# Altium schematic symbol library jlcpcb_2025_04_capacitors_extended_1206.schlib: 2503 symbols (part 10 of 14)
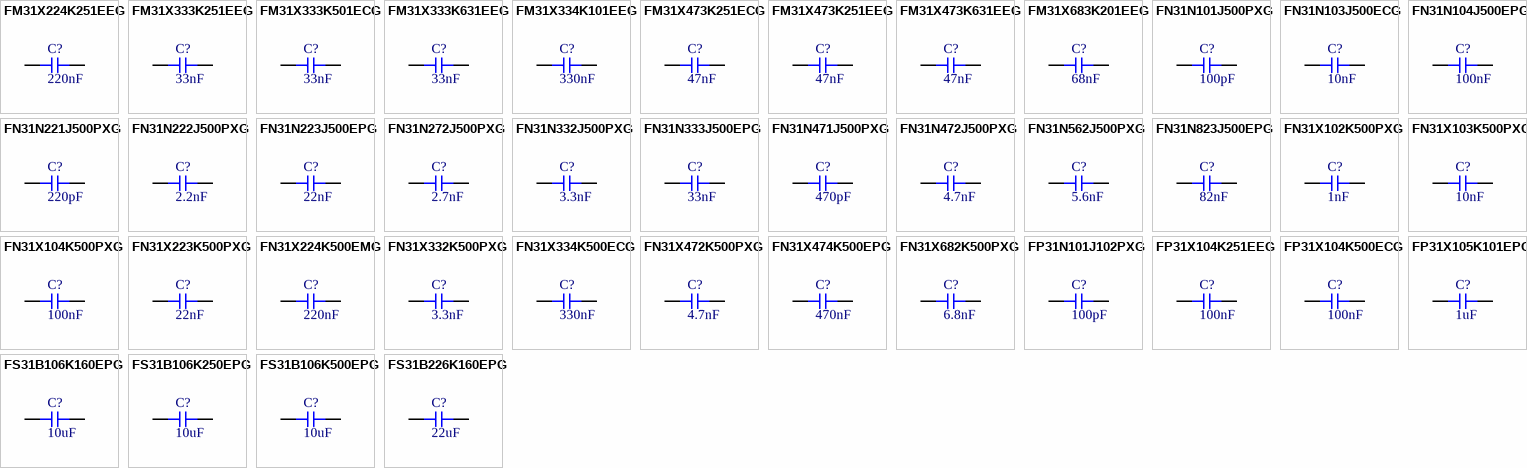
[diagram p71: symbols FM31X224K251EEG to FS31B226K160EPG]

## FN31N101J500PXG
designator C?  Capacitance: 100pF  (hidden comment: *)
Capacitor, Ceramic (MLCC), 100pF, 50V, C0G, SMD 1206; Manufacturer: PSA(Prosperity Dielectrics); Manufacturer Part Number: FN31N101J500PXG; Package Size: 1206; JLCPCB Basic Part: No; JLCPCB Part Number: C2915682; Supplier 1: LCSC; Category: Capacitors - MLCC; Supplier Part Number 1: C2915682; Voltage Rating: 50V; Temperature Coefficient: C0G; RoHS: Yes; ComponentLink1Description: Datasheet; ComponentLink1URL: https://wmsc.lcsc.com/wmsc/upload/file/pdf/v2/lcsc/2111172030_PSA-Prosperity-Dielectrics-FN31N101J500PXG_C2915682.pdf; ComponentLink2Description: JLCPCB Part URL; ComponentLink2URL: https://jlcpcb.com/partdetail/C2915682; ComponentLink3Description: LCSC Part URL; ComponentLink3URL: https://lcsc.com/product-detail/Multilayer-Ceramic-Capacitors-MLCC---SMD-SMT_PSAProsperity-Dielectrics-PSAProsperity-Dielectrics-FN31N101J500PXG_C2915682.html
footprint CAP-1206 (1206 (3216M) Capacitor)
pins: 1, 2

## FN31N103J500ECG
designator C?  Capacitance: 10nF  (hidden comment: *)
Capacitor, Ceramic (MLCC), 10nF, ±5%, 50V, NP0, ±5%, SMD 1206; Manufacturer: PSA(Prosperity Dielectrics); Manufacturer Part Number: FN31N103J500ECG; Package Size: 1206; JLCPCB Basic Part: No; JLCPCB Part Number: C784097; Supplier 1: LCSC; Category: Capacitors - MLCC; Supplier Part Number 1: C784097; Tolerance: ±5%; Voltage Rating: 50V; Temperature Coefficient: NP0; RoHS: Yes; ComponentLink1Description: Datasheet; ComponentLink1URL: https://wmsc.lcsc.com/wmsc/upload/file/pdf/v2/lcsc/2304140030_PSA-Prosperity-Dielectrics-FN31N103J500ECG_C784097.pdf; ComponentLink2Description: JLCPCB Part URL; ComponentLink2URL: https://jlcpcb.com/partdetail/C784097; ComponentLink3Description: LCSC Part URL; ComponentLink3URL: https://lcsc.com/product-detail/Multilayer-Ceramic-Capacitors-MLCC---SMD-SMT_PSAProsperity-Dielectrics-PSAProsperity-Dielectrics-FN31N103J500ECG_C784097.html
footprint CAP-1206 (1206 (3216M) Capacitor)
pins: 1, 2

## FN31N104J500EPG
designator C?  Capacitance: 100nF  (hidden comment: *)
Capacitor, Ceramic (MLCC), 100nF, 50V, C0G, SMD 1206; Manufacturer: PSA(Prosperity Dielectrics); Manufacturer Part Number: FN31N104J500EPG; Package Size: 1206; JLCPCB Basic Part: No; JLCPCB Part Number: C2874765; Supplier 1: LCSC; Category: Capacitors - MLCC; Supplier Part Number 1: C2874765; Voltage Rating: 50V; Temperature Coefficient: C0G; RoHS: Yes; ComponentLink1Description: Datasheet; ComponentLink1URL: https://wmsc.lcsc.com/wmsc/upload/file/pdf/v2/lcsc/2108150330_PSA-Prosperity-Dielectrics-FN31N104J500EPG_C2874765.pdf; ComponentLink2Description: JLCPCB Part URL; ComponentLink2URL: https://jlcpcb.com/partdetail/C2874765; ComponentLink3Description: LCSC Part URL; ComponentLink3URL: https://lcsc.com/product-detail/Multilayer-Ceramic-Capacitors-MLCC---SMD-SMT_PSAProsperity-Dielectrics-PSAProsperity-Dielectrics-FN31N104J500EPG_C2874765.html
footprint CAP-1206 (1206 (3216M) Capacitor)
pins: 1, 2

## FN31N221J500PXG
designator C?  Capacitance: 220pF  (hidden comment: *)
Capacitor, Ceramic (MLCC), 220pF, ±5%, 50V, C0G, ±5%, SMD 1206; Manufacturer: PSA(Prosperity Dielectrics); Manufacturer Part Number: FN31N221J500PXG; Package Size: 1206; JLCPCB Basic Part: No; JLCPCB Part Number: C2915684; Supplier 1: LCSC; Category: Capacitors - MLCC; Supplier Part Number 1: C2915684; Tolerance: ±5%; Voltage Rating: 50V; Temperature Coefficient: C0G; RoHS: Yes; ComponentLink1Description: Datasheet; ComponentLink1URL: https://wmsc.lcsc.com/wmsc/upload/file/pdf/v2/lcsc/2111172030_PSA-Prosperity-Dielectrics-FN31N221J500PXG_C2915684.pdf; ComponentLink2Description: JLCPCB Part URL; ComponentLink2URL: https://jlcpcb.com/partdetail/C2915684; ComponentLink3Description: LCSC Part URL; ComponentLink3URL: https://lcsc.com/product-detail/Multilayer-Ceramic-Capacitors-MLCC---SMD-SMT_PSAProsperity-Dielectrics-PSAProsperity-Dielectrics-FN31N221J500PXG_C2915684.html
footprint CAP-1206 (1206 (3216M) Capacitor)
pins: 1, 2

## FN31N222J500PXG
designator C?  Capacitance: 2.2nF  (hidden comment: *)
Capacitor, Ceramic (MLCC), 2.2nF, ±5%, 50V, NP0, ±5%, SMD 1206; Manufacturer: PSA(Prosperity Dielectrics); Manufacturer Part Number: FN31N222J500PXG; Package Size: 1206; JLCPCB Basic Part: No; JLCPCB Part Number: C784098; Supplier 1: LCSC; Category: Capacitors - MLCC; Supplier Part Number 1: C784098; Tolerance: ±5%; Voltage Rating: 50V; Temperature Coefficient: NP0; RoHS: Yes; ComponentLink1Description: Datasheet; ComponentLink1URL: https://wmsc.lcsc.com/wmsc/upload/file/pdf/v2/lcsc/2304140030_PSA-Prosperity-Dielectrics-FN31N222J500PXG_C784098.pdf; ComponentLink2Description: JLCPCB Part URL; ComponentLink2URL: https://jlcpcb.com/partdetail/C784098; ComponentLink3Description: LCSC Part URL; ComponentLink3URL: https://lcsc.com/product-detail/Multilayer-Ceramic-Capacitors-MLCC---SMD-SMT_PSAProsperity-Dielectrics-PSAProsperity-Dielectrics-FN31N222J500PXG_C784098.html
footprint CAP-1206 (1206 (3216M) Capacitor)
pins: 1, 2

## FN31N223J500EPG
designator C?  Capacitance: 22nF  (hidden comment: *)
Capacitor, Ceramic (MLCC), 22nF, ±5%, 50V, ±5%, SMD 1206; Manufacturer: PSA(Prosperity Dielectrics); Manufacturer Part Number: FN31N223J500EPG; Package Size: 1206; JLCPCB Basic Part: No; JLCPCB Part Number: C784099; Supplier 1: LCSC; Category: Capacitors - MLCC; Supplier Part Number 1: C784099; Tolerance: ±5%; Voltage Rating: 50V; RoHS: Yes; ComponentLink1Description: Datasheet; ComponentLink1URL: https://wmsc.lcsc.com/wmsc/upload/file/pdf/v2/lcsc/2304140030_PSA-Prosperity-Dielectrics-FN31N223J500EPG_C784099.pdf; ComponentLink2Description: JLCPCB Part URL; ComponentLink2URL: https://jlcpcb.com/partdetail/C784099; ComponentLink3Description: LCSC Part URL; ComponentLink3URL: https://lcsc.com/product-detail/Multilayer-Ceramic-Capacitors-MLCC---SMD-SMT_PSAProsperity-Dielectrics-PSAProsperity-Dielectrics-FN31N223J500EPG_C784099.html
footprint CAP-1206 (1206 (3216M) Capacitor)
pins: 1, 2

## FN31N272J500PXG
designator C?  Capacitance: 2.7nF  (hidden comment: *)
Capacitor, Ceramic (MLCC), 2.7nF, ±5%, 50V, C0G, ±5%, SMD 1206; Manufacturer: PSA(Prosperity Dielectrics); Manufacturer Part Number: FN31N272J500PXG; Package Size: 1206; JLCPCB Basic Part: No; JLCPCB Part Number: C2915685; Supplier 1: LCSC; Category: Capacitors - MLCC; Supplier Part Number 1: C2915685; Tolerance: ±5%; Voltage Rating: 50V; Temperature Coefficient: C0G; RoHS: Yes; ComponentLink1Description: Datasheet; ComponentLink1URL: https://wmsc.lcsc.com/wmsc/upload/file/pdf/v2/lcsc/2111161830_PSA-Prosperity-Dielectrics-FN31N272J500PXG_C2915685.pdf; ComponentLink2Description: JLCPCB Part URL; ComponentLink2URL: https://jlcpcb.com/partdetail/C2915685; ComponentLink3Description: LCSC Part URL; ComponentLink3URL: https://lcsc.com/product-detail/Multilayer-Ceramic-Capacitors-MLCC---SMD-SMT_PSAProsperity-Dielectrics-PSAProsperity-Dielectrics-FN31N272J500PXG_C2915685.html
footprint CAP-1206 (1206 (3216M) Capacitor)
pins: 1, 2

## FN31N332J500PXG
designator C?  Capacitance: 3.3nF  (hidden comment: *)
Capacitor, Ceramic (MLCC), 3.3nF, ±5%, 50V, C0G, ±5%, SMD 1206; Manufacturer: PSA(Prosperity Dielectrics); Manufacturer Part Number: FN31N332J500PXG; Package Size: 1206; JLCPCB Basic Part: No; JLCPCB Part Number: C2847434; Supplier 1: LCSC; Category: Capacitors - MLCC; Supplier Part Number 1: C2847434; Tolerance: ±5%; Voltage Rating: 50V; Temperature Coefficient: C0G; RoHS: Yes; ComponentLink1Description: Datasheet; ComponentLink1URL: https://wmsc.lcsc.com/wmsc/upload/file/pdf/v2/lcsc/2108142230_PSA-Prosperity-Dielectrics-FN31N332J500PXG_C2847434.pdf; ComponentLink2Description: JLCPCB Part URL; ComponentLink2URL: https://jlcpcb.com/partdetail/C2847434; ComponentLink3Description: LCSC Part URL; ComponentLink3URL: https://lcsc.com/product-detail/Multilayer-Ceramic-Capacitors-MLCC---SMD-SMT_PSAProsperity-Dielectrics-PSAProsperity-Dielectrics-FN31N332J500PXG_C2847434.html
footprint CAP-1206 (1206 (3216M) Capacitor)
pins: 1, 2

## FN31N333J500EPG
designator C?  Capacitance: 33nF  (hidden comment: *)
Capacitor, Ceramic (MLCC), 33nF, 50V, C0G, SMD 1206; Manufacturer: PSA(Prosperity Dielectrics); Manufacturer Part Number: FN31N333J500EPG; Package Size: 1206; JLCPCB Basic Part: No; JLCPCB Part Number: C2843403; Supplier 1: LCSC; Category: Capacitors - MLCC; Supplier Part Number 1: C2843403; Voltage Rating: 50V; Temperature Coefficient: C0G; RoHS: Yes; ComponentLink1Description: Datasheet; ComponentLink1URL: https://wmsc.lcsc.com/wmsc/upload/file/pdf/v2/lcsc/2201201730_PSA-Prosperity-Dielectrics-FN31N333J500EPG_C2843403.pdf; ComponentLink2Description: JLCPCB Part URL; ComponentLink2URL: https://jlcpcb.com/partdetail/C2843403; ComponentLink3Description: LCSC Part URL; ComponentLink3URL: https://lcsc.com/product-detail/Multilayer-Ceramic-Capacitors-MLCC---SMD-SMT_PSAProsperity-Dielectrics-PSAProsperity-Dielectrics-FN31N333J500EPG_C2843403.html
footprint CAP-1206 (1206 (3216M) Capacitor)
pins: 1, 2

## FN31N471J500PXG
designator C?  Capacitance: 470pF  (hidden comment: *)
Capacitor, Ceramic (MLCC), 470pF, ±5%, 50V, C0G, ±5%, SMD 1206; Manufacturer: PSA(Prosperity Dielectrics); Manufacturer Part Number: FN31N471J500PXG; Package Size: 1206; JLCPCB Basic Part: No; JLCPCB Part Number: C2915686; Supplier 1: LCSC; Category: Capacitors - MLCC; Supplier Part Number 1: C2915686; Tolerance: ±5%; Voltage Rating: 50V; Temperature Coefficient: C0G; RoHS: Yes; ComponentLink1Description: Datasheet; ComponentLink1URL: https://wmsc.lcsc.com/wmsc/upload/file/pdf/v2/lcsc/2111161830_PSA-Prosperity-Dielectrics-FN31N471J500PXG_C2915686.pdf; ComponentLink2Description: JLCPCB Part URL; ComponentLink2URL: https://jlcpcb.com/partdetail/C2915686; ComponentLink3Description: LCSC Part URL; ComponentLink3URL: https://lcsc.com/product-detail/Multilayer-Ceramic-Capacitors-MLCC---SMD-SMT_PSAProsperity-Dielectrics-PSAProsperity-Dielectrics-FN31N471J500PXG_C2915686.html
footprint CAP-1206 (1206 (3216M) Capacitor)
pins: 1, 2

## FN31N472J500PXG
designator C?  Capacitance: 4.7nF  (hidden comment: *)
Capacitor, Ceramic (MLCC), 4.7nF, ±5%, 50V, C0G, ±5%, SMD 1206; Manufacturer: PSA(Prosperity Dielectrics); Manufacturer Part Number: FN31N472J500PXG; Package Size: 1206; JLCPCB Basic Part: No; JLCPCB Part Number: C2915687; Supplier 1: LCSC; Category: Capacitors - MLCC; Supplier Part Number 1: C2915687; Tolerance: ±5%; Voltage Rating: 50V; Temperature Coefficient: C0G; RoHS: Yes; ComponentLink1Description: Datasheet; ComponentLink1URL: https://wmsc.lcsc.com/wmsc/upload/file/pdf/v2/lcsc/2111161830_PSA-Prosperity-Dielectrics-FN31N472J500PXG_C2915687.pdf; ComponentLink2Description: JLCPCB Part URL; ComponentLink2URL: https://jlcpcb.com/partdetail/C2915687; ComponentLink3Description: LCSC Part URL; ComponentLink3URL: https://lcsc.com/product-detail/Multilayer-Ceramic-Capacitors-MLCC---SMD-SMT_PSAProsperity-Dielectrics-PSAProsperity-Dielectrics-FN31N472J500PXG_C2915687.html
footprint CAP-1206 (1206 (3216M) Capacitor)
pins: 1, 2

## FN31N562J500PXG
designator C?  Capacitance: 5.6nF  (hidden comment: *)
Capacitor, Ceramic (MLCC), 5.6nF, ±5%, 50V, C0G, ±5%, SMD 1206; Manufacturer: PSA(Prosperity Dielectrics); Manufacturer Part Number: FN31N562J500PXG; Package Size: 1206; JLCPCB Basic Part: No; JLCPCB Part Number: C2929748; Supplier 1: LCSC; Category: Capacitors - MLCC; Supplier Part Number 1: C2929748; Tolerance: ±5%; Voltage Rating: 50V; Temperature Coefficient: C0G; RoHS: Yes; ComponentLink1Description: Datasheet; ComponentLink1URL: https://wmsc.lcsc.com/wmsc/upload/file/pdf/v2/lcsc/2209061730_PSA-Prosperity-Dielectrics-FN31N562J500PXG_C2929748.pdf; ComponentLink2Description: JLCPCB Part URL; ComponentLink2URL: https://jlcpcb.com/partdetail/C2929748; ComponentLink3Description: LCSC Part URL; ComponentLink3URL: https://lcsc.com/product-detail/Multilayer-Ceramic-Capacitors-MLCC---SMD-SMT_PSAProsperity-Dielectrics-PSAProsperity-Dielectrics-FN31N562J500PXG_C2929748.html
footprint CAP-1206 (1206 (3216M) Capacitor)
pins: 1, 2

## FN31N823J500EPG
designator C?  Capacitance: 82nF  (hidden comment: *)
Capacitor, Ceramic (MLCC), 82nF, 50V, C0G, SMD 1206; Manufacturer: PSA(Prosperity Dielectrics); Manufacturer Part Number: FN31N823J500EPG; Package Size: 1206; JLCPCB Basic Part: No; JLCPCB Part Number: C2958812; Supplier 1: LCSC; Category: Capacitors - MLCC; Supplier Part Number 1: C2958812; Voltage Rating: 50V; Temperature Coefficient: C0G; RoHS: Yes; ComponentLink1Description: Datasheet; ComponentLink1URL: https://wmsc.lcsc.com/wmsc/upload/file/pdf/v2/lcsc/2201201730_PSA-Prosperity-Dielectrics-FN31N823J500EPG_C2958812.pdf; ComponentLink2Description: JLCPCB Part URL; ComponentLink2URL: https://jlcpcb.com/partdetail/C2958812; ComponentLink3Description: LCSC Part URL; ComponentLink3URL: https://lcsc.com/product-detail/Multilayer-Ceramic-Capacitors-MLCC---SMD-SMT_PSAProsperity-Dielectrics-PSAProsperity-Dielectrics-FN31N823J500EPG_C2958812.html
footprint CAP-1206 (1206 (3216M) Capacitor)
pins: 1, 2

## FN31X102K500PXG
designator C?  Capacitance: 1nF  (hidden comment: *)
Capacitor, Ceramic (MLCC), 1nF, 50V, SMD 1206; Manufacturer: PSA(Prosperity Dielectrics); Manufacturer Part Number: FN31X102K500PXG; Package Size: 1206; JLCPCB Basic Part: No; JLCPCB Part Number: C2836874; Supplier 1: LCSC; Category: Capacitors - MLCC; Supplier Part Number 1: C2836874; Voltage Rating: 50V; RoHS: Yes; ComponentLink1Description: Datasheet; ComponentLink1URL: https://wmsc.lcsc.com/wmsc/upload/file/pdf/v2/lcsc/2304140030_PSA-Prosperity-Dielectrics-FN31X102K500PXG_C2836874.pdf; ComponentLink2Description: JLCPCB Part URL; ComponentLink2URL: https://jlcpcb.com/partdetail/C2836874; ComponentLink3Description: LCSC Part URL; ComponentLink3URL: https://lcsc.com/product-detail/Multilayer-Ceramic-Capacitors-MLCC---SMD-SMT_PSAProsperity-Dielectrics-PSAProsperity-Dielectrics-FN31X102K500PXG_C2836874.html
footprint CAP-1206 (1206 (3216M) Capacitor)
pins: 1, 2

## FN31X103K500PXG
designator C?  Capacitance: 10nF  (hidden comment: *)
Capacitor, Ceramic (MLCC), 10nF, ±10%, 50V, X7R, ±10%, SMD 1206; Manufacturer: PSA(Prosperity Dielectrics); Manufacturer Part Number: FN31X103K500PXG; Package Size: 1206; JLCPCB Basic Part: No; JLCPCB Part Number: C525316; Supplier 1: LCSC; Category: Capacitors - MLCC; Supplier Part Number 1: C525316; Tolerance: ±10%; Voltage Rating: 50V; Temperature Coefficient: X7R; RoHS: Yes; ComponentLink1Description: Datasheet; ComponentLink1URL: https://wmsc.lcsc.com/wmsc/upload/file/pdf/v2/lcsc/2304140030_PSA-Prosperity-Dielectrics-FN31X103K500PXG_C525316.pdf; ComponentLink2Description: JLCPCB Part URL; ComponentLink2URL: https://jlcpcb.com/partdetail/C525316; ComponentLink3Description: LCSC Part URL; ComponentLink3URL: https://lcsc.com/product-detail/Multilayer-Ceramic-Capacitors-MLCC---SMD-SMT_PSAProsperity-Dielectrics-PSAProsperity-Dielectrics-FN31X103K500PXG_C525316.html
footprint CAP-1206 (1206 (3216M) Capacitor)
pins: 1, 2

## FN31X104K500PXG
designator C?  Capacitance: 100nF  (hidden comment: *)
Capacitor, Ceramic (MLCC), 100nF, ±10%, 50V, X7R, ±10%, SMD 1206; Manufacturer: PSA(Prosperity Dielectrics); Manufacturer Part Number: FN31X104K500PXG; Package Size: 1206; JLCPCB Basic Part: No; JLCPCB Part Number: C464972; Supplier 1: LCSC; Category: Capacitors - MLCC; Supplier Part Number 1: C464972; Tolerance: ±10%; Voltage Rating: 50V; Temperature Coefficient: X7R; RoHS: Yes; ComponentLink1Description: Datasheet; ComponentLink1URL: https://wmsc.lcsc.com/wmsc/upload/file/pdf/v2/lcsc/2304140030_PSA-Prosperity-Dielectrics-FN31X104K500PXG_C464972.pdf; ComponentLink2Description: JLCPCB Part URL; ComponentLink2URL: https://jlcpcb.com/partdetail/C464972; ComponentLink3Description: LCSC Part URL; ComponentLink3URL: https://lcsc.com/product-detail/Multilayer-Ceramic-Capacitors-MLCC---SMD-SMT_PSAProsperity-Dielectrics-PSAProsperity-Dielectrics-FN31X104K500PXG_C464972.html
footprint CAP-1206 (1206 (3216M) Capacitor)
pins: 1, 2

## FN31X223K500PXG
designator C?  Capacitance: 22nF  (hidden comment: *)
Capacitor, Ceramic (MLCC), 22nF, 50V, X7R, SMD 1206; Manufacturer: PSA(Prosperity Dielectrics); Manufacturer Part Number: FN31X223K500PXG; Package Size: 1206; JLCPCB Basic Part: No; JLCPCB Part Number: C2915690; Supplier 1: LCSC; Category: Capacitors - MLCC; Supplier Part Number 1: C2915690; Voltage Rating: 50V; Temperature Coefficient: X7R; RoHS: Yes; ComponentLink1Description: Datasheet; ComponentLink1URL: https://wmsc.lcsc.com/wmsc/upload/file/pdf/v2/lcsc/2111172030_PSA-Prosperity-Dielectrics-FN31X223K500PXG_C2915690.pdf; ComponentLink2Description: JLCPCB Part URL; ComponentLink2URL: https://jlcpcb.com/partdetail/C2915690; ComponentLink3Description: LCSC Part URL; ComponentLink3URL: https://lcsc.com/product-detail/Multilayer-Ceramic-Capacitors-MLCC---SMD-SMT_PSAProsperity-Dielectrics-PSAProsperity-Dielectrics-FN31X223K500PXG_C2915690.html
footprint CAP-1206 (1206 (3216M) Capacitor)
pins: 1, 2

## FN31X224K500EMG
designator C?  Capacitance: 220nF  (hidden comment: *)
Capacitor, Ceramic (MLCC), 220nF, ±10%, 50V, X7R, ±10%, SMD 1206; Manufacturer: PSA(Prosperity Dielectrics); Manufacturer Part Number: FN31X224K500EMG; Package Size: 1206; JLCPCB Basic Part: No; JLCPCB Part Number: C525317; Supplier 1: LCSC; Category: Capacitors - MLCC; Supplier Part Number 1: C525317; Tolerance: ±10%; Voltage Rating: 50V; Temperature Coefficient: X7R; RoHS: Yes; ComponentLink1Description: Datasheet; ComponentLink1URL: https://wmsc.lcsc.com/wmsc/upload/file/pdf/v2/lcsc/2304140030_PSA-Prosperity-Dielectrics-FN31X224K500EMG_C525317.pdf; ComponentLink2Description: JLCPCB Part URL; ComponentLink2URL: https://jlcpcb.com/partdetail/C525317; ComponentLink3Description: LCSC Part URL; ComponentLink3URL: https://lcsc.com/product-detail/Multilayer-Ceramic-Capacitors-MLCC---SMD-SMT_PSAProsperity-Dielectrics-PSAProsperity-Dielectrics-FN31X224K500EMG_C525317.html
footprint CAP-1206 (1206 (3216M) Capacitor)
pins: 1, 2

## FN31X332K500PXG
designator C?  Capacitance: 3.3nF  (hidden comment: *)
Capacitor, Ceramic (MLCC), 3.3nF, 50V, X7R, SMD 1206; Manufacturer: PSA(Prosperity Dielectrics); Manufacturer Part Number: FN31X332K500PXG; Package Size: 1206; JLCPCB Basic Part: No; JLCPCB Part Number: C2915691; Supplier 1: LCSC; Category: Capacitors - MLCC; Supplier Part Number 1: C2915691; Voltage Rating: 50V; Temperature Coefficient: X7R; RoHS: Yes; ComponentLink1Description: Datasheet; ComponentLink1URL: https://wmsc.lcsc.com/wmsc/upload/file/pdf/v2/lcsc/2111172030_PSA-Prosperity-Dielectrics-FN31X332K500PXG_C2915691.pdf; ComponentLink2Description: JLCPCB Part URL; ComponentLink2URL: https://jlcpcb.com/partdetail/C2915691; ComponentLink3Description: LCSC Part URL; ComponentLink3URL: https://lcsc.com/product-detail/Multilayer-Ceramic-Capacitors-MLCC---SMD-SMT_PSAProsperity-Dielectrics-PSAProsperity-Dielectrics-FN31X332K500PXG_C2915691.html
footprint CAP-1206 (1206 (3216M) Capacitor)
pins: 1, 2

## FN31X334K500ECG
designator C?  Capacitance: 330nF  (hidden comment: *)
Capacitor, Ceramic (MLCC), 330nF, ±10%, 50V, ±10%, SMD 1206; Manufacturer: PSA(Prosperity Dielectrics); Manufacturer Part Number: FN31X334K500ECG; Package Size: 1206; JLCPCB Basic Part: No; JLCPCB Part Number: C784100; Supplier 1: LCSC; Category: Capacitors - MLCC; Supplier Part Number 1: C784100; Tolerance: ±10%; Voltage Rating: 50V; RoHS: Yes; ComponentLink1Description: Datasheet; ComponentLink1URL: https://wmsc.lcsc.com/wmsc/upload/file/pdf/v2/lcsc/2304140030_PSA-Prosperity-Dielectrics-FN31X334K500ECG_C784100.pdf; ComponentLink2Description: JLCPCB Part URL; ComponentLink2URL: https://jlcpcb.com/partdetail/C784100; ComponentLink3Description: LCSC Part URL; ComponentLink3URL: https://lcsc.com/product-detail/Multilayer-Ceramic-Capacitors-MLCC---SMD-SMT_PSAProsperity-Dielectrics-PSAProsperity-Dielectrics-FN31X334K500ECG_C784100.html
footprint CAP-1206 (1206 (3216M) Capacitor)
pins: 1, 2

## FN31X472K500PXG
designator C?  Capacitance: 4.7nF  (hidden comment: *)
Capacitor, Ceramic (MLCC), 4.7nF, ±10%, 50V, X7R, ±10%, SMD 1206; Manufacturer: PSA(Prosperity Dielectrics); Manufacturer Part Number: FN31X472K500PXG; Package Size: 1206; JLCPCB Basic Part: No; JLCPCB Part Number: C2915693; Supplier 1: LCSC; Category: Capacitors - MLCC; Supplier Part Number 1: C2915693; Tolerance: ±10%; Voltage Rating: 50V; Temperature Coefficient: X7R; RoHS: Yes; ComponentLink1Description: Datasheet; ComponentLink1URL: https://wmsc.lcsc.com/wmsc/upload/file/pdf/v2/lcsc/2111161830_PSA-Prosperity-Dielectrics-FN31X472K500PXG_C2915693.pdf; ComponentLink2Description: JLCPCB Part URL; ComponentLink2URL: https://jlcpcb.com/partdetail/C2915693; ComponentLink3Description: LCSC Part URL; ComponentLink3URL: https://lcsc.com/product-detail/Multilayer-Ceramic-Capacitors-MLCC---SMD-SMT_PSAProsperity-Dielectrics-PSAProsperity-Dielectrics-FN31X472K500PXG_C2915693.html
footprint CAP-1206 (1206 (3216M) Capacitor)
pins: 1, 2

## FN31X474K500EPG
designator C?  Capacitance: 470nF  (hidden comment: *)
Capacitor, Ceramic (MLCC), 470nF, ±10%, 50V, X7R, ±10%, SMD 1206; Manufacturer: PSA(Prosperity Dielectrics); Manufacturer Part Number: FN31X474K500EPG; Package Size: 1206; JLCPCB Basic Part: No; JLCPCB Part Number: C525318; Supplier 1: LCSC; Category: Capacitors - MLCC; Supplier Part Number 1: C525318; Tolerance: ±10%; Voltage Rating: 50V; Temperature Coefficient: X7R; RoHS: Yes; ComponentLink1Description: Datasheet; ComponentLink1URL: https://wmsc.lcsc.com/wmsc/upload/file/pdf/v2/lcsc/2304140030_PSA-Prosperity-Dielectrics-FN31X474K500EPG_C525318.pdf; ComponentLink2Description: JLCPCB Part URL; ComponentLink2URL: https://jlcpcb.com/partdetail/C525318; ComponentLink3Description: LCSC Part URL; ComponentLink3URL: https://lcsc.com/product-detail/Multilayer-Ceramic-Capacitors-MLCC---SMD-SMT_PSAProsperity-Dielectrics-PSAProsperity-Dielectrics-FN31X474K500EPG_C525318.html
footprint CAP-1206 (1206 (3216M) Capacitor)
pins: 1, 2

## FN31X682K500PXG
designator C?  Capacitance: 6.8nF  (hidden comment: *)
Capacitor, Ceramic (MLCC), 6.8nF, ±10%, 50V, X7R, ±10%, SMD 1206; Manufacturer: PSA(Prosperity Dielectrics); Manufacturer Part Number: FN31X682K500PXG; Package Size: 1206; JLCPCB Basic Part: No; JLCPCB Part Number: C2915695; Supplier 1: LCSC; Category: Capacitors - MLCC; Supplier Part Number 1: C2915695; Tolerance: ±10%; Voltage Rating: 50V; Temperature Coefficient: X7R; RoHS: Yes; ComponentLink1Description: Datasheet; ComponentLink1URL: https://wmsc.lcsc.com/wmsc/upload/file/pdf/v2/lcsc/2111161830_PSA-Prosperity-Dielectrics-FN31X682K500PXG_C2915695.pdf; ComponentLink2Description: JLCPCB Part URL; ComponentLink2URL: https://jlcpcb.com/partdetail/C2915695; ComponentLink3Description: LCSC Part URL; ComponentLink3URL: https://lcsc.com/product-detail/Multilayer-Ceramic-Capacitors-MLCC---SMD-SMT_PSAProsperity-Dielectrics-PSAProsperity-Dielectrics-FN31X682K500PXG_C2915695.html
footprint CAP-1206 (1206 (3216M) Capacitor)
pins: 1, 2

## FP31N101J102PXG
designator C?  Capacitance: 100pF  (hidden comment: *)
Capacitor, Ceramic (MLCC), 100pF, ±5%, 1kV, NP0, ±5%, SMD 1206; Manufacturer: PSA(Prosperity Dielectrics); Manufacturer Part Number: FP31N101J102PXG; Package Size: 1206; JLCPCB Basic Part: No; JLCPCB Part Number: C525321; Supplier 1: LCSC; Category: Capacitors - MLCC; Supplier Part Number 1: C525321; Tolerance: ±5%; Voltage Rating: 1kV; Temperature Coefficient: NP0; RoHS: Yes; ComponentLink1Description: Datasheet; ComponentLink1URL: https://wmsc.lcsc.com/wmsc/upload/file/pdf/v2/lcsc/2304140030_PSA-Prosperity-Dielectrics-FP31N101J102PXG_C525321.pdf; ComponentLink2Description: JLCPCB Part URL; ComponentLink2URL: https://jlcpcb.com/partdetail/C525321; ComponentLink3Description: LCSC Part URL; ComponentLink3URL: https://lcsc.com/product-detail/Multilayer-Ceramic-Capacitors-MLCC---SMD-SMT_PSAProsperity-Dielectrics-PSAProsperity-Dielectrics-FP31N101J102PXG_C525321.html
footprint CAP-1206 (1206 (3216M) Capacitor)
pins: 1, 2

## FP31X104K251EEG
designator C?  Capacitance: 100nF  (hidden comment: *)
Capacitor, Ceramic (MLCC), 100nF, ±10%, 250V, X7R, ±10%, SMD 1206; Manufacturer: PSA(Prosperity Dielectrics); Manufacturer Part Number: FP31X104K251EEG; Package Size: 1206; JLCPCB Basic Part: No; JLCPCB Part Number: C1021620; Supplier 1: LCSC; Category: Capacitors - MLCC; Supplier Part Number 1: C1021620; Tolerance: ±10%; Voltage Rating: 250V; Temperature Coefficient: X7R; RoHS: Yes; ComponentLink1Description: Datasheet; ComponentLink1URL: https://wmsc.lcsc.com/wmsc/upload/file/pdf/v2/lcsc/2208251630_PSA-Prosperity-Dielectrics-FP31X104K251EEG_C1021620.pdf; ComponentLink2Description: JLCPCB Part URL; ComponentLink2URL: https://jlcpcb.com/partdetail/C1021620; ComponentLink3Description: LCSC Part URL; ComponentLink3URL: https://lcsc.com/product-detail/Multilayer-Ceramic-Capacitors-MLCC---SMD-SMT_PSAProsperity-Dielectrics-PSAProsperity-Dielectrics-FP31X104K251EEG_C1021620.html
footprint CAP-1206 (1206 (3216M) Capacitor)
pins: 1, 2

## FP31X104K500ECG
designator C?  Capacitance: 100nF  (hidden comment: *)
Capacitor, Ceramic (MLCC), 100nF, 50V, X7R, SMD 1206; Manufacturer: PSA(Prosperity Dielectrics); Manufacturer Part Number: FP31X104K500ECG; Package Size: 1206; JLCPCB Basic Part: No; JLCPCB Part Number: C2929186; Supplier 1: LCSC; Category: Capacitors - MLCC; Supplier Part Number 1: C2929186; Voltage Rating: 50V; Temperature Coefficient: X7R; RoHS: Yes; ComponentLink1Description: Datasheet; ComponentLink1URL: https://wmsc.lcsc.com/wmsc/upload/file/pdf/v2/lcsc/2201121400_PSA-Prosperity-Dielectrics-FP31X104K500ECG_C2929186.pdf; ComponentLink2Description: JLCPCB Part URL; ComponentLink2URL: https://jlcpcb.com/partdetail/C2929186; ComponentLink3Description: LCSC Part URL; ComponentLink3URL: https://lcsc.com/product-detail/Multilayer-Ceramic-Capacitors-MLCC---SMD-SMT_PSAProsperity-Dielectrics-PSAProsperity-Dielectrics-FP31X104K500ECG_C2929186.html
footprint CAP-1206 (1206 (3216M) Capacitor)
pins: 1, 2

## FP31X105K101EPG
designator C?  Capacitance: 1uF  (hidden comment: *)
Capacitor, Ceramic (MLCC), 1uF, ±10%, 100V, X7R, ±10%, SMD 1206; Manufacturer: PSA(Prosperity Dielectrics); Manufacturer Part Number: FP31X105K101EPG; Package Size: 1206; JLCPCB Basic Part: No; JLCPCB Part Number: C1021619; Supplier 1: LCSC; Category: Capacitors - MLCC; Supplier Part Number 1: C1021619; Tolerance: ±10%; Voltage Rating: 100V; Temperature Coefficient: X7R; RoHS: Yes; ComponentLink1Description: Datasheet; ComponentLink1URL: https://wmsc.lcsc.com/wmsc/upload/file/pdf/v2/lcsc/2304140030_PSA-Prosperity-Dielectrics-FP31X105K101EPG_C1021619.pdf; ComponentLink2Description: JLCPCB Part URL; ComponentLink2URL: https://jlcpcb.com/partdetail/C1021619; ComponentLink3Description: LCSC Part URL; ComponentLink3URL: https://lcsc.com/product-detail/Multilayer-Ceramic-Capacitors-MLCC---SMD-SMT_PSAProsperity-Dielectrics-PSAProsperity-Dielectrics-FP31X105K101EPG_C1021619.html
footprint CAP-1206 (1206 (3216M) Capacitor)
pins: 1, 2

## FS31B106K160EPG
designator C?  Capacitance: 10uF  (hidden comment: *)
Capacitor, Ceramic (MLCC), 10uF, ±10%, 16V, X5R, ±10%, SMD 1206; Manufacturer: PSA(Prosperity Dielectrics); Manufacturer Part Number: FS31B106K160EPG; Package Size: 1206; JLCPCB Basic Part: No; JLCPCB Part Number: C363563; Supplier 1: LCSC; Category: Capacitors - MLCC; Supplier Part Number 1: C363563; Tolerance: ±10%; Voltage Rating: 16V; Temperature Coefficient: X5R; RoHS: Yes; ComponentLink1Description: Datasheet; ComponentLink1URL: https://wmsc.lcsc.com/wmsc/upload/file/pdf/v2/lcsc/2304140030_PSA-Prosperity-Dielectrics-FS31B106K160EPG_C363563.pdf; ComponentLink2Description: JLCPCB Part URL; ComponentLink2URL: https://jlcpcb.com/partdetail/C363563; ComponentLink3Description: LCSC Part URL; ComponentLink3URL: https://lcsc.com/product-detail/Multilayer-Ceramic-Capacitors-MLCC---SMD-SMT_PSAProsperity-Dielectrics-PSAProsperity-Dielectrics-FS31B106K160EPG_C363563.html
footprint CAP-1206 (1206 (3216M) Capacitor)
pins: 1, 2

## FS31B106K250EPG
designator C?  Capacitance: 10uF  (hidden comment: *)
Capacitor, Ceramic (MLCC), 10uF, ±10%, 25V, X5R, ±10%, SMD 1206; Manufacturer: PSA(Prosperity Dielectrics); Manufacturer Part Number: FS31B106K250EPG; Package Size: 1206; JLCPCB Basic Part: No; JLCPCB Part Number: C2929198; Supplier 1: LCSC; Category: Capacitors - MLCC; Supplier Part Number 1: C2929198; Tolerance: ±10%; Voltage Rating: 25V; Temperature Coefficient: X5R; RoHS: Yes; ComponentLink1Description: Datasheet; ComponentLink1URL: https://wmsc.lcsc.com/wmsc/upload/file/pdf/v2/lcsc/2201121400_PSA-Prosperity-Dielectrics-FS31B106K250EPG_C2929198.pdf; ComponentLink2Description: JLCPCB Part URL; ComponentLink2URL: https://jlcpcb.com/partdetail/C2929198; ComponentLink3Description: LCSC Part URL; ComponentLink3URL: https://lcsc.com/product-detail/Multilayer-Ceramic-Capacitors-MLCC---SMD-SMT_PSAProsperity-Dielectrics-PSAProsperity-Dielectrics-FS31B106K250EPG_C2929198.html
footprint CAP-1206 (1206 (3216M) Capacitor)
pins: 1, 2

## FS31B106K500EPG
designator C?  Capacitance: 10uF  (hidden comment: *)
Capacitor, Ceramic (MLCC), 10uF, ±10%, 50V, X5R, ±10%, SMD 1206; Manufacturer: PSA(Prosperity Dielectrics); Manufacturer Part Number: FS31B106K500EPG; Package Size: 1206; JLCPCB Basic Part: No; JLCPCB Part Number: C2874766; Supplier 1: LCSC; Category: Capacitors - MLCC; Supplier Part Number 1: C2874766; Tolerance: ±10%; Voltage Rating: 50V; Temperature Coefficient: X5R; RoHS: Yes; ComponentLink1Description: Datasheet; ComponentLink1URL: https://wmsc.lcsc.com/wmsc/upload/file/pdf/v2/lcsc/2108150330_PSA-Prosperity-Dielectrics-FS31B106K500EPG_C2874766.pdf; ComponentLink2Description: JLCPCB Part URL; ComponentLink2URL: https://jlcpcb.com/partdetail/C2874766; ComponentLink3Description: LCSC Part URL; ComponentLink3URL: https://lcsc.com/product-detail/Multilayer-Ceramic-Capacitors-MLCC---SMD-SMT_PSAProsperity-Dielectrics-PSAProsperity-Dielectrics-FS31B106K500EPG_C2874766.html
footprint CAP-1206 (1206 (3216M) Capacitor)
pins: 1, 2

## FS31B226K160EPG
designator C?  Capacitance: 22uF  (hidden comment: *)
Capacitor, Ceramic (MLCC), 22uF, ±10%, 16V, X5R, ±10%, SMD 1206; Manufacturer: PSA(Prosperity Dielectrics); Manufacturer Part Number: FS31B226K160EPG; Package Size: 1206; JLCPCB Basic Part: No; JLCPCB Part Number: C525346; Supplier 1: LCSC; Category: Capacitors - MLCC; Supplier Part Number 1: C525346; Tolerance: ±10%; Voltage Rating: 16V; Temperature Coefficient: X5R; RoHS: Yes; ComponentLink1Description: Datasheet; ComponentLink1URL: https://wmsc.lcsc.com/wmsc/upload/file/pdf/v2/lcsc/2304140030_PSA-Prosperity-Dielectrics-FS31B226K160EPG_C525346.pdf; ComponentLink2Description: JLCPCB Part URL; ComponentLink2URL: https://jlcpcb.com/partdetail/C525346; ComponentLink3Description: LCSC Part URL; ComponentLink3URL: https://lcsc.com/product-detail/Multilayer-Ceramic-Capacitors-MLCC---SMD-SMT_PSAProsperity-Dielectrics-PSAProsperity-Dielectrics-FS31B226K160EPG_C525346.html
footprint CAP-1206 (1206 (3216M) Capacitor)
pins: 1, 2

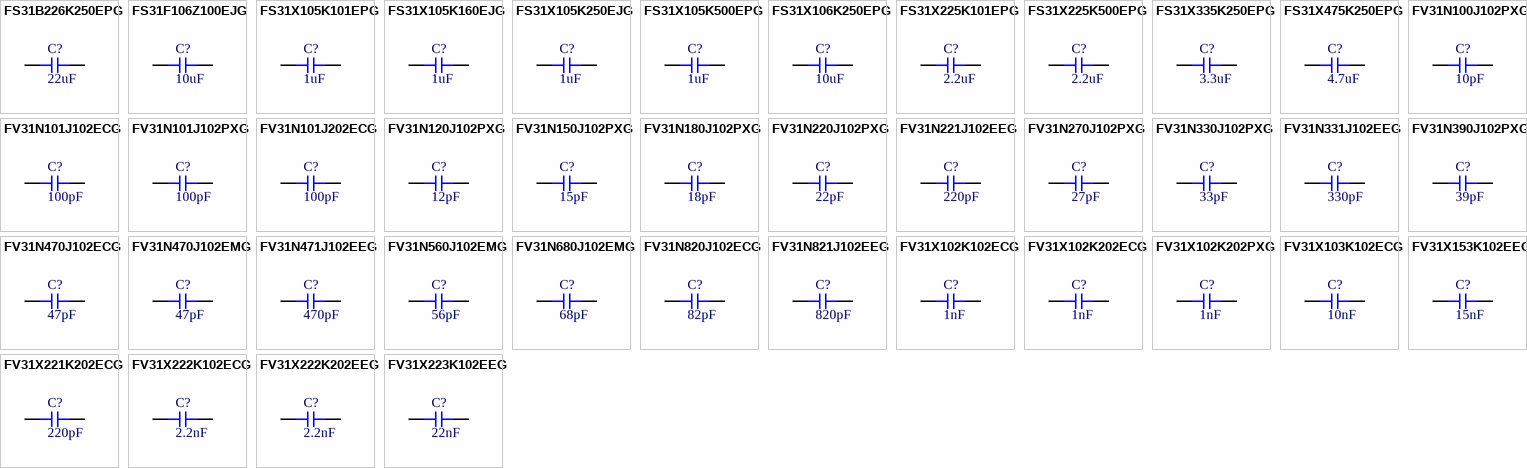
[diagram p42: symbols FS31B226K250EPG to FV31X223K102EEG]

## FS31B226K250EPG
designator C?  Capacitance: 22uF  (hidden comment: *)
Capacitor, Ceramic (MLCC), 22uF, ±10%, 25V, X5R, ±10%, SMD 1206; Manufacturer: PSA(Prosperity Dielectrics); Manufacturer Part Number: FS31B226K250EPG; Package Size: 1206; JLCPCB Basic Part: No; JLCPCB Part Number: C2874767; Supplier 1: LCSC; Category: Capacitors - MLCC; Supplier Part Number 1: C2874767; Tolerance: ±10%; Voltage Rating: 25V; Temperature Coefficient: X5R; RoHS: Yes; ComponentLink1Description: Datasheet; ComponentLink1URL: https://wmsc.lcsc.com/wmsc/upload/file/pdf/v2/lcsc/2108150330_PSA-Prosperity-Dielectrics-FS31B226K250EPG_C2874767.pdf; ComponentLink2Description: JLCPCB Part URL; ComponentLink2URL: https://jlcpcb.com/partdetail/C2874767; ComponentLink3Description: LCSC Part URL; ComponentLink3URL: https://lcsc.com/product-detail/Multilayer-Ceramic-Capacitors-MLCC---SMD-SMT_PSAProsperity-Dielectrics-PSAProsperity-Dielectrics-FS31B226K250EPG_C2874767.html
footprint CAP-1206 (1206 (3216M) Capacitor)
pins: 1, 2

## FS31F106Z100EJG
designator C?  Capacitance: 10uF  (hidden comment: *)
Capacitor, Ceramic (MLCC), 10uF, 10V, Y5V, SMD 1206; Manufacturer: PSA(Prosperity Dielectrics); Manufacturer Part Number: FS31F106Z100EJG; Temperature Rating: -20%~+80%; Package Size: 1206; JLCPCB Basic Part: No; JLCPCB Part Number: C525347; Supplier 1: LCSC; Category: Capacitors - MLCC; Supplier Part Number 1: C525347; Voltage Rating: 10V; Temperature Coefficient: Y5V; RoHS: Yes; ComponentLink1Description: Datasheet; ComponentLink1URL: https://wmsc.lcsc.com/wmsc/upload/file/pdf/v2/lcsc/2304140030_PSA-Prosperity-Dielectrics-FS31F106Z100EJG_C525347.pdf; ComponentLink2Description: JLCPCB Part URL; ComponentLink2URL: https://jlcpcb.com/partdetail/C525347; ComponentLink3Description: LCSC Part URL; ComponentLink3URL: https://lcsc.com/product-detail/Multilayer-Ceramic-Capacitors-MLCC---SMD-SMT_PSAProsperity-Dielectrics-PSAProsperity-Dielectrics-FS31F106Z100EJG_C525347.html
footprint CAP-1206 (1206 (3216M) Capacitor)
pins: 1, 2

## FS31X105K101EPG
designator C?  Capacitance: 1uF  (hidden comment: *)
Capacitor, Ceramic (MLCC), 1uF, ±10%, 100V, X7R, ±10%, SMD 1206; Manufacturer: PSA(Prosperity Dielectrics); Manufacturer Part Number: FS31X105K101EPG; Package Size: 1206; JLCPCB Basic Part: No; JLCPCB Part Number: C363566; Supplier 1: LCSC; Category: Capacitors - MLCC; Supplier Part Number 1: C363566; Tolerance: ±10%; Voltage Rating: 100V; Temperature Coefficient: X7R; RoHS: Yes; ComponentLink1Description: Datasheet; ComponentLink1URL: https://wmsc.lcsc.com/wmsc/upload/file/pdf/v2/lcsc/2304140030_PSA-Prosperity-Dielectrics-FS31X105K101EPG_C363566.pdf; ComponentLink2Description: JLCPCB Part URL; ComponentLink2URL: https://jlcpcb.com/partdetail/C363566; ComponentLink3Description: LCSC Part URL; ComponentLink3URL: https://lcsc.com/product-detail/Multilayer-Ceramic-Capacitors-MLCC---SMD-SMT_PSAProsperity-Dielectrics-PSAProsperity-Dielectrics-FS31X105K101EPG_C363566.html
footprint CAP-1206 (1206 (3216M) Capacitor)
pins: 1, 2

## FS31X105K160EJG
designator C?  Capacitance: 1uF  (hidden comment: *)
Capacitor, Ceramic (MLCC), 1uF, ±10%, 16V, X7R, ±10%, SMD 1206; Manufacturer: PSA(Prosperity Dielectrics); Manufacturer Part Number: FS31X105K160EJG; Package Size: 1206; JLCPCB Basic Part: No; JLCPCB Part Number: C525348; Supplier 1: LCSC; Category: Capacitors - MLCC; Supplier Part Number 1: C525348; Tolerance: ±10%; Voltage Rating: 16V; Temperature Coefficient: X7R; RoHS: Yes; ComponentLink1Description: Datasheet; ComponentLink1URL: https://wmsc.lcsc.com/wmsc/upload/file/pdf/v2/lcsc/2304140030_PSA-Prosperity-Dielectrics-FS31X105K160EJG_C525348.pdf; ComponentLink2Description: JLCPCB Part URL; ComponentLink2URL: https://jlcpcb.com/partdetail/C525348; ComponentLink3Description: LCSC Part URL; ComponentLink3URL: https://lcsc.com/product-detail/Multilayer-Ceramic-Capacitors-MLCC---SMD-SMT_PSAProsperity-Dielectrics-PSAProsperity-Dielectrics-FS31X105K160EJG_C525348.html
footprint CAP-1206 (1206 (3216M) Capacitor)
pins: 1, 2

## FS31X105K250EJG
designator C?  Capacitance: 1uF  (hidden comment: *)
Capacitor, Ceramic (MLCC), 1uF, ±10%, 25V, X7R, ±10%, SMD 1206; Manufacturer: PSA(Prosperity Dielectrics); Manufacturer Part Number: FS31X105K250EJG; Package Size: 1206; JLCPCB Basic Part: No; JLCPCB Part Number: C525349; Supplier 1: LCSC; Category: Capacitors - MLCC; Supplier Part Number 1: C525349; Tolerance: ±10%; Voltage Rating: 25V; Temperature Coefficient: X7R; RoHS: Yes; ComponentLink1Description: Datasheet; ComponentLink1URL: https://wmsc.lcsc.com/wmsc/upload/file/pdf/v2/lcsc/2304140030_PSA-Prosperity-Dielectrics-FS31X105K250EJG_C525349.pdf; ComponentLink2Description: JLCPCB Part URL; ComponentLink2URL: https://jlcpcb.com/partdetail/C525349; ComponentLink3Description: LCSC Part URL; ComponentLink3URL: https://lcsc.com/product-detail/Multilayer-Ceramic-Capacitors-MLCC---SMD-SMT_PSAProsperity-Dielectrics-PSAProsperity-Dielectrics-FS31X105K250EJG_C525349.html
footprint CAP-1206 (1206 (3216M) Capacitor)
pins: 1, 2

## FS31X105K500EPG
designator C?  Capacitance: 1uF  (hidden comment: *)
Capacitor, Ceramic (MLCC), 1uF, ±10%, 50V, X7R, ±10%, SMD 1206; Manufacturer: PSA(Prosperity Dielectrics); Manufacturer Part Number: FS31X105K500EPG; Package Size: 1206; JLCPCB Basic Part: No; JLCPCB Part Number: C394162; Supplier 1: LCSC; Category: Capacitors - MLCC; Supplier Part Number 1: C394162; Tolerance: ±10%; Voltage Rating: 50V; Temperature Coefficient: X7R; RoHS: Yes; ComponentLink1Description: Datasheet; ComponentLink1URL: https://wmsc.lcsc.com/wmsc/upload/file/pdf/v2/lcsc/2304140030_PSA-Prosperity-Dielectrics-FS31X105K500EPG_C394162.pdf; ComponentLink2Description: JLCPCB Part URL; ComponentLink2URL: https://jlcpcb.com/partdetail/C394162; ComponentLink3Description: LCSC Part URL; ComponentLink3URL: https://lcsc.com/product-detail/Multilayer-Ceramic-Capacitors-MLCC---SMD-SMT_PSAProsperity-Dielectrics-PSAProsperity-Dielectrics-FS31X105K500EPG_C394162.html
footprint CAP-1206 (1206 (3216M) Capacitor)
pins: 1, 2

## FS31X106K250EPG
designator C?  Capacitance: 10uF  (hidden comment: *)
Capacitor, Ceramic (MLCC), 10uF, ±10%, 25V, X7R, ±10%, SMD 1206; Manufacturer: PSA(Prosperity Dielectrics); Manufacturer Part Number: FS31X106K250EPG; Package Size: 1206; JLCPCB Basic Part: No; JLCPCB Part Number: C525350; Supplier 1: LCSC; Category: Capacitors - MLCC; Supplier Part Number 1: C525350; Tolerance: ±10%; Voltage Rating: 25V; Temperature Coefficient: X7R; RoHS: Yes; ComponentLink1Description: Datasheet; ComponentLink1URL: https://wmsc.lcsc.com/wmsc/upload/file/pdf/v2/lcsc/2304140030_PSA-Prosperity-Dielectrics-FS31X106K250EPG_C525350.pdf; ComponentLink2Description: JLCPCB Part URL; ComponentLink2URL: https://jlcpcb.com/partdetail/C525350; ComponentLink3Description: LCSC Part URL; ComponentLink3URL: https://lcsc.com/product-detail/Multilayer-Ceramic-Capacitors-MLCC---SMD-SMT_PSAProsperity-Dielectrics-PSAProsperity-Dielectrics-FS31X106K250EPG_C525350.html
footprint CAP-1206 (1206 (3216M) Capacitor)
pins: 1, 2

## FS31X225K101EPG
designator C?  Capacitance: 2.2uF  (hidden comment: *)
Capacitor, Ceramic (MLCC), 2.2uF, ±10%, 100V, ±10%, SMD 1206; Manufacturer: PSA(Prosperity Dielectrics); Manufacturer Part Number: FS31X225K101EPG; Package Size: 1206; JLCPCB Basic Part: No; JLCPCB Part Number: C1021612; Supplier 1: LCSC; Category: Capacitors - MLCC; Supplier Part Number 1: C1021612; Tolerance: ±10%; Voltage Rating: 100V; RoHS: Yes; ComponentLink1Description: Datasheet; ComponentLink1URL: https://wmsc.lcsc.com/wmsc/upload/file/pdf/v2/lcsc/2012231312_PSA-Prosperity-Dielectrics-FS31X225K101EPG_C1021612.pdf; ComponentLink2Description: JLCPCB Part URL; ComponentLink2URL: https://jlcpcb.com/partdetail/C1021612; ComponentLink3Description: LCSC Part URL; ComponentLink3URL: https://lcsc.com/product-detail/Multilayer-Ceramic-Capacitors-MLCC---SMD-SMT_PSAProsperity-Dielectrics-PSAProsperity-Dielectrics-FS31X225K101EPG_C1021612.html
footprint CAP-1206 (1206 (3216M) Capacitor)
pins: 1, 2

## FS31X225K500EPG
designator C?  Capacitance: 2.2uF  (hidden comment: *)
Capacitor, Ceramic (MLCC), 2.2uF, ±10%, 50V, X7R, ±10%, SMD 1206; Manufacturer: PSA(Prosperity Dielectrics); Manufacturer Part Number: FS31X225K500EPG; Package Size: 1206; JLCPCB Basic Part: No; JLCPCB Part Number: C525351; Supplier 1: LCSC; Category: Capacitors - MLCC; Supplier Part Number 1: C525351; Tolerance: ±10%; Voltage Rating: 50V; Temperature Coefficient: X7R; RoHS: Yes; ComponentLink1Description: Datasheet; ComponentLink1URL: https://wmsc.lcsc.com/wmsc/upload/file/pdf/v2/lcsc/2304140030_PSA-Prosperity-Dielectrics-FS31X225K500EPG_C525351.pdf; ComponentLink2Description: JLCPCB Part URL; ComponentLink2URL: https://jlcpcb.com/partdetail/C525351; ComponentLink3Description: LCSC Part URL; ComponentLink3URL: https://lcsc.com/product-detail/Multilayer-Ceramic-Capacitors-MLCC---SMD-SMT_PSAProsperity-Dielectrics-PSAProsperity-Dielectrics-FS31X225K500EPG_C525351.html
footprint CAP-1206 (1206 (3216M) Capacitor)
pins: 1, 2

## FS31X335K250EPG
designator C?  Capacitance: 3.3uF  (hidden comment: *)
Capacitor, Ceramic (MLCC), 3.3uF, ±10%, 25V, ±10%, SMD 1206; Manufacturer: PSA(Prosperity Dielectrics); Manufacturer Part Number: FS31X335K250EPG; Package Size: 1206; JLCPCB Basic Part: No; JLCPCB Part Number: C2843399; Supplier 1: LCSC; Category: Capacitors - MLCC; Supplier Part Number 1: C2843399; Tolerance: ±10%; Voltage Rating: 25V; RoHS: Yes; ComponentLink1Description: Datasheet; ComponentLink1URL: https://wmsc.lcsc.com/wmsc/upload/file/pdf/v2/lcsc/2108072030_PSA-Prosperity-Dielectrics-FS31X335K250EPG_C2843399.pdf; ComponentLink2Description: JLCPCB Part URL; ComponentLink2URL: https://jlcpcb.com/partdetail/C2843399; ComponentLink3Description: LCSC Part URL; ComponentLink3URL: https://lcsc.com/product-detail/Multilayer-Ceramic-Capacitors-MLCC---SMD-SMT_PSAProsperity-Dielectrics-PSAProsperity-Dielectrics-FS31X335K250EPG_C2843399.html
footprint CAP-1206 (1206 (3216M) Capacitor)
pins: 1, 2

## FS31X475K250EPG
designator C?  Capacitance: 4.7uF  (hidden comment: *)
Capacitor, Ceramic (MLCC), 4.7uF, ±10%, 25V, X7R, ±10%, SMD 1206; Manufacturer: PSA(Prosperity Dielectrics); Manufacturer Part Number: FS31X475K250EPG; Package Size: 1206; JLCPCB Basic Part: No; JLCPCB Part Number: C525352; Supplier 1: LCSC; Category: Capacitors - MLCC; Supplier Part Number 1: C525352; Tolerance: ±10%; Voltage Rating: 25V; Temperature Coefficient: X7R; RoHS: Yes; ComponentLink1Description: Datasheet; ComponentLink1URL: https://wmsc.lcsc.com/wmsc/upload/file/pdf/v2/lcsc/2304140030_PSA-Prosperity-Dielectrics-FS31X475K250EPG_C525352.pdf; ComponentLink2Description: JLCPCB Part URL; ComponentLink2URL: https://jlcpcb.com/partdetail/C525352; ComponentLink3Description: LCSC Part URL; ComponentLink3URL: https://lcsc.com/product-detail/Multilayer-Ceramic-Capacitors-MLCC---SMD-SMT_PSAProsperity-Dielectrics-PSAProsperity-Dielectrics-FS31X475K250EPG_C525352.html
footprint CAP-1206 (1206 (3216M) Capacitor)
pins: 1, 2